# Altium footprint library Buttons.PcbLib: 23 footprints (part 2 of 2)
Each footprint in its own frame and in the unit in brackets; x right, y up, seen from the top. Pads: shape width x height; smd on the part's side, far side on the other; paste and mask are expansions set on the pad; w line width, h text height; cw(c..) or ccw(c..) is an arc to the next point about the centre after c.
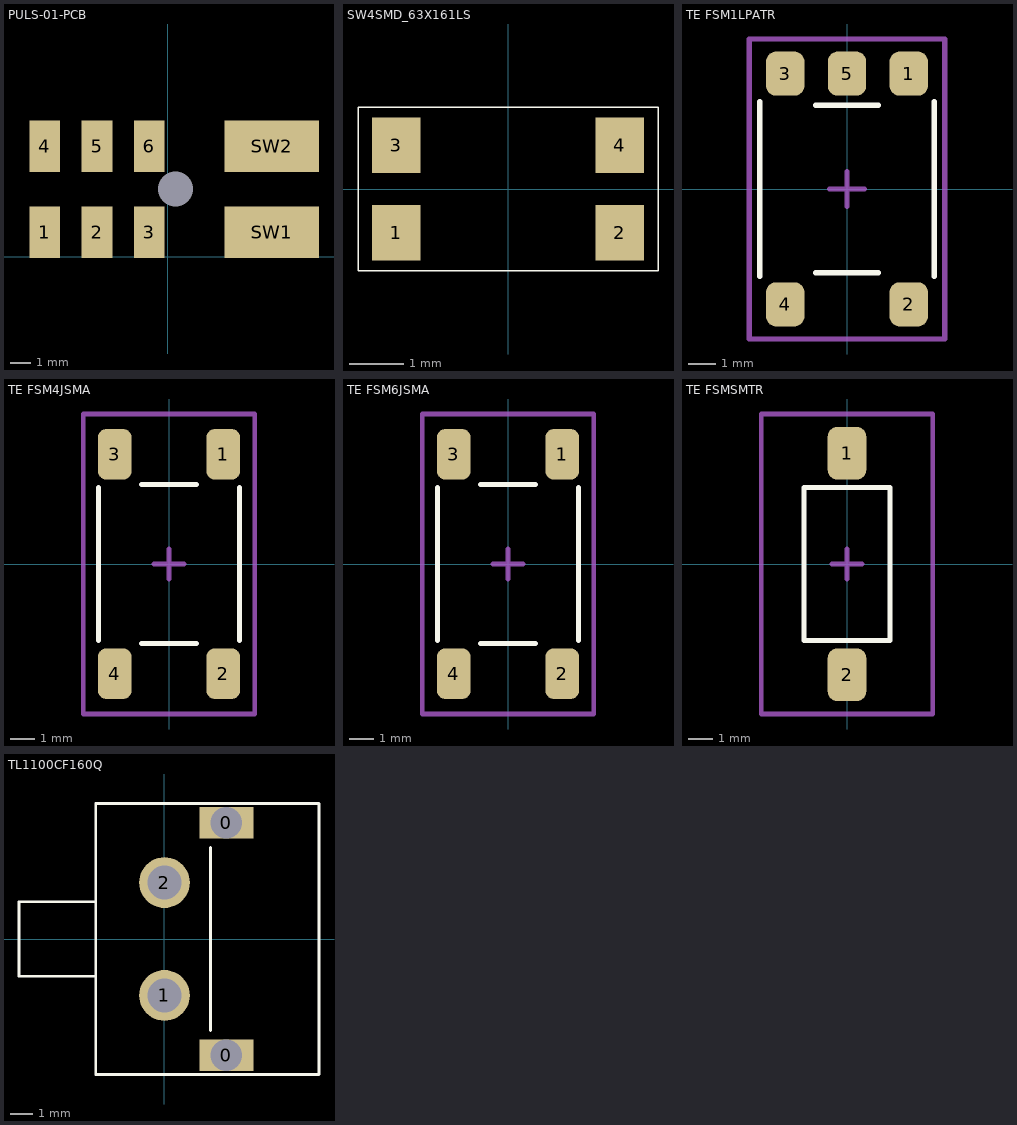
[diagram p1: the footprints below, top view; thin cyan lines are the x and y axes]

## PULS-01-PCB [mil]
pads (9):
  rect 0x0 hole 66.93 square unplated: 0(15,130)
  rect 59.06x98.43 smd: 1(-235,47) 2(-135,47) 3(-35,47) 4(-235,212) 5(-135,212) 6(-35,212)
  rect 181.1x98.43 smd mask+5.51: SW1(199,47) SW2(199,212)
3D body "TARJETA SWITCH.step": height 740.37, standoff -62.5, extent -274,-385.87 300,255.87

## SW4SMD_63X161LS [mil] "SW4SMD_63X161LS"
pads (4):
  rect 35x40 smd mask+2: 1(-80.71,-31.5) 2(80.71,-31.5) 3(-80.71,31.5) 4(80.71,31.5)
Top Overlay:
  lines w1: -108.27,-59.06 -108.27,59.06 108.27,59.06 108.27,-59.06 -108.27,-59.06
3D body "User Library-Switch-CK-KMR2.STEP": height 82.68, standoff 0, extent -90.55,-59.05 90.56,59.06

## TE FSM1LPATR [mm]
height 3.1
pads (5):
  rrect50% 1.395x1.6 smd: 1(2.25,4.2) 2(2.25,-4.2) 3(-2.25,4.2) 4(-2.25,-4.2) 5(0,4.2)
Top Overlay:
  lines w0.2: -3.175,-3.175 -3.175,3.175 ; -1.143,-3.048 1.143,-3.048 ; -1.143,3.048 1.143,3.048 ; 3.175,-3.175 3.175,3.175
Mechanical 15:
  lines w0.2: -0.635,0 0.635,0 ; 0,-0.635 0,0.635 ; -3.556,-5.461 -3.556,5.461 3.556,5.461 3.556,-5.461 -3.556,-5.461
3D body "FSM1LPATR.STEP": height 3.1, standoff 0, extent -3.1,-4 3.1,4

## TE FSM4JSMA [mm]
height 5.08
pads (4):
  rrect50% 1.4x2.1 smd: 1(2.25,4.55) 2(2.25,-4.55) 3(-2.25,4.55) 4(-2.25,-4.55)
Top Overlay:
  lines w0.2: -2.921,-3.175 -2.921,3.175 ; -1.143,-3.302 1.143,-3.302 ; -1.143,3.302 1.143,3.302 ; 2.921,-3.175 2.921,3.175
Mechanical 15:
  lines w0.2: -0.635,0 0.635,0 ; 0,-0.635 0,0.635 ; -3.556,-6.223 3.556,-6.223 3.556,6.223 -3.556,6.223 -3.556,-6.223
3D body "FSM4JSMA.STEP": height 5.08, standoff 0, extent -3,-5 3,5

## TE FSM6JSMA [mm]
height 7.11
pads (4):
  rrect50% 1.4x2.1 smd: 1(2.25,4.55) 2(2.25,-4.55) 3(-2.25,4.55) 4(-2.25,-4.55)
Top Overlay:
  lines w0.2: -2.921,-3.175 -2.921,3.175 ; -1.143,-3.302 1.143,-3.302 ; -1.143,3.302 1.143,3.302 ; 2.921,-3.175 2.921,3.175
Mechanical 15:
  lines w0.2: -0.635,0 0.635,0 ; 0,-0.635 0,0.635 ; -3.556,-6.223 3.556,-6.223 3.556,6.223 -3.556,6.223 -3.556,-6.223
3D body "FSM6JSMA.STEP": height 7.11, standoff 0, extent -3,-5 3,5

## TE FSMSMTR [mm]
height 4.42
pads (2):
  rrect50% 1.6x2.19 smd: 1(0,4.595) 2(0,-4.595)
Top Overlay:
  lines w0.2: -1.778,-3.175 1.778,-3.175 1.778,3.175 -1.778,3.175 -1.778,-3.175
Mechanical 15:
  lines w0.2: -0.635,0 0.635,0 ; 0,-0.635 0,0.635 ; -3.556,-6.223 -3.556,6.223 3.556,6.223 3.556,-6.223 -3.556,-6.223
3D body "FSMSMTR.STEP": height 4.42, standoff 0, extent -1.75,-4.984 1.75,4.985

## TL1100CF160Q [mm]
pads (4):
  rect 2.4x1.4 hole 1.4 square unplated: 0(2.743,-5.156) 0(2.743,5.156)
  round 2.25 hole 1.5: 1(0,-2.5) 2(0,2.5)
Top Overlay:
  lines w0.127: 2.032,-4.064 2.032,4.064 ; -3.05,-1.65 -3.05,-6 6.85,-6 6.85,6 -3.05,6 -3.05,1.65 ; -3.05,-1.65 -3.05,1.65 ; -3.05,-1.65 -6.45,-1.65 -6.45,1.65 -3.05,1.65
3D body "TL1100CF160Q.step": height 14.71, standoff -3.59, extent -6.448,-6.525 6.858,6.575